# Altium footprint library разъёмы.PcbLib: 129 footprints (part 8 of 9)
Each footprint in its own frame and in the unit in brackets; x right, y up, seen from the top. Pads: shape width x height; smd on the part's side, far side on the other; paste and mask are expansions set on the pad; w line width, h text height; cw(c..) or ccw(c..) is an arc to the next point about the centre after c.
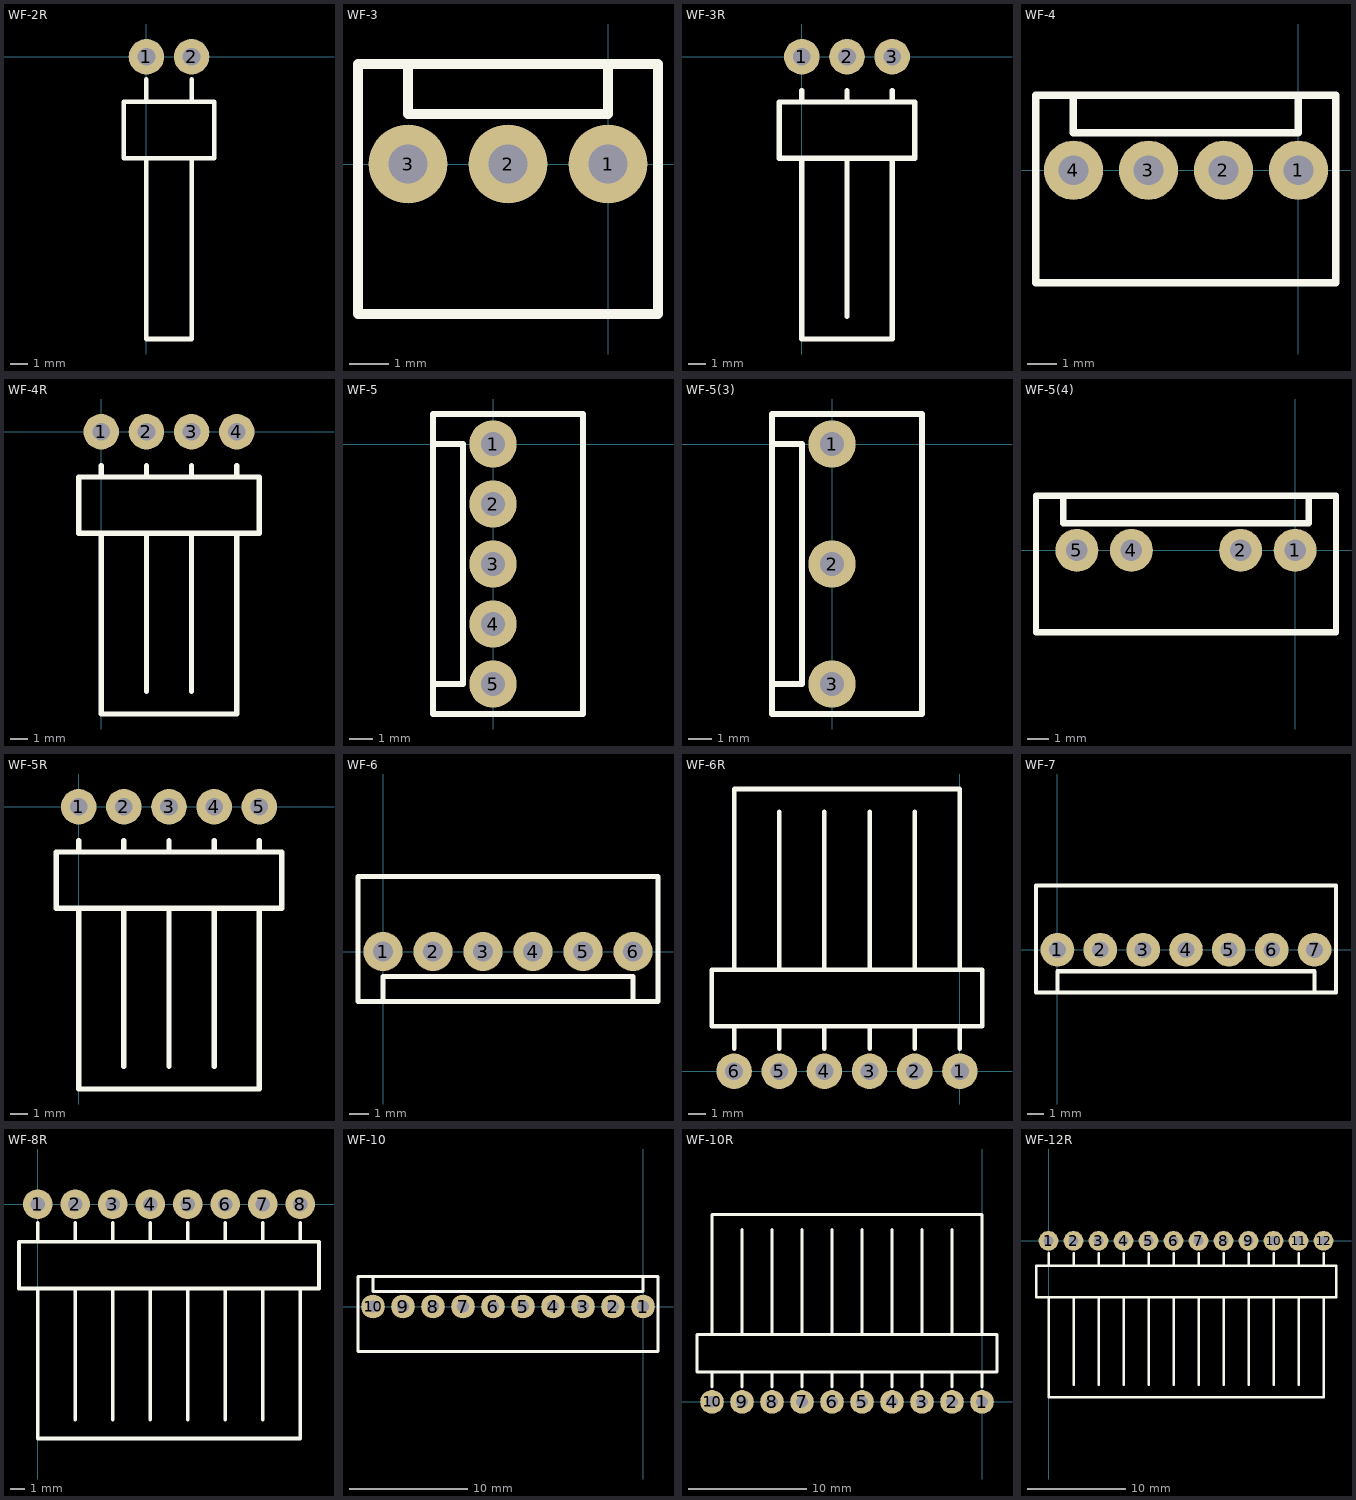
[diagram p7: the footprints below, top view; thin cyan lines are the x and y axes]

## WF-2R [mm]
pads (2):
  round 2 hole 1: 1(0,0) 2(2.54,0)
Top Overlay:
  lines w0.254: 0,-2.54 0,-1.27 ; 2.54,-5.715 2.54,-15.875 0,-15.875 0,-5.715 -1.27,-5.715 ; 2.54,-2.54 2.54,-1.27 ; -1.27,-5.715 3.81,-5.715 3.81,-2.54 -1.27,-2.54 -1.27,-5.715

## WF-3 [mm]
pads (3):
  round 2 hole 1: 1(0,0) 2(-2.54,0) 3(-5.08,0)
Top Overlay:
  lines w0.254: -5.08,2.54 -5.08,1.27 0,1.27 0,2.54 ; -6.35,-3.81 -6.35,2.54 1.27,2.54 1.27,-3.81 -6.35,-3.81

## WF-3R [mm]
pads (3):
  round 2 hole 1: 1(0,0) 2(2.54,0) 3(5.08,0)
Top Overlay:
  lines w0.3: 0,-2.54 0,-1.905 ; 2.54,-14.605 2.54,-5.715 ; 2.54,-2.54 2.54,-1.905 ; 5.08,-5.715 5.08,-15.875 0,-15.875 0,-5.715 -1.27,-5.715 ; 5.08,-2.54 5.08,-1.905 ; -1.27,-5.715 6.35,-5.715 6.35,-2.54 -1.27,-2.54 -1.27,-5.715

## WF-4 [mm]
pads (4):
  round 2 hole 1: 1(0,0) 2(-2.54,0) 3(-5.08,0) 4(-7.62,0)
Top Overlay:
  lines w0.254: -7.62,2.54 -7.62,1.27 0,1.27 0,2.54 ; -8.89,-3.81 -8.89,2.54 1.27,2.54 1.27,-3.81 -8.89,-3.81

## WF-4R [mm]
pads (4):
  round 2 hole 1: 1(0,0) 2(2.54,0) 3(5.08,0) 4(7.62,0)
Top Overlay:
  lines w0.3: 0,-2.54 0,-1.905 ; 2.54,-14.605 2.54,-5.715 ; 2.54,-2.54 2.54,-1.905 ; 5.08,-14.605 5.08,-5.715 ; 5.08,-2.54 5.08,-1.905 ; 7.62,-2.54 7.62,-1.905 ; -1.27,-5.715 0,-5.715 0,-15.875 7.62,-15.875 7.62,-5.715 8.89,-5.715 ; -1.27,-5.715 -1.27,-2.54 8.89,-2.54 8.89,-5.715 ; -1.27,-5.715 8.89,-5.715

## WF-5 [mm]
pads (5):
  round 2 hole 1: 1(0,0) 2(0,-2.54) 3(0,-5.08) 4(0,-7.62) 5(0,-10.16)
Top Overlay:
  lines w0.254: -2.54,-10.16 -1.27,-10.16 -1.27,0 -2.54,0 ; -2.54,-11.43 -2.54,1.27 3.81,1.27 3.81,-11.43 -2.54,-11.43

## WF-5(3) [mm]
pads (3):
  round 2 hole 1: 1(0,0) 2(0,-5.08) 3(0,-10.16)
Top Overlay:
  lines w0.254: -2.54,-10.16 -1.27,-10.16 -1.27,0 -2.54,0 ; -2.54,-11.43 -2.54,1.27 3.81,1.27 3.81,-11.43 -2.54,-11.43

## WF-5(4) [mm]
pads (4):
  round 2 hole 1: 1(0,0) 2(-2.54,0) 4(-7.62,0) 5(-10.16,0)
Top Overlay:
  lines w0.3: -10.795,2.54 -10.795,1.27 0.635,1.27 0.635,2.54 ; -12.065,-3.81 -12.065,2.54 1.905,2.54 1.905,-3.81 -12.065,-3.81

## WF-5R [mm]
pads (5):
  round 2 hole 1: 1(0,0) 2(2.54,0) 3(5.08,0) 4(7.62,0) 5(10.16,0)
Top Overlay:
  lines w0.3: 0,-2.54 0,-1.905 ; 2.54,-14.605 2.54,-5.715 ; 2.54,-2.54 2.54,-1.905 ; 5.08,-14.605 5.08,-5.715 ; 5.08,-2.54 5.08,-1.905 ; 7.62,-14.605 7.62,-5.715 ; 7.62,-2.54 7.62,-1.905 ; 10.16,-2.54 10.16,-1.905 ; -1.27,-5.715 0,-5.715 0,-15.875 10.16,-15.875 10.16,-5.715 ; -1.27,-5.715 -1.27,-2.54 11.43,-2.54 11.43,-5.715 10.16,-5.715 ; -1.27,-5.715 10.16,-5.715

## WF-6 [mm]
pads (6):
  round 2 hole 1: 1(0,0) 2(2.54,0) 3(5.08,0) 4(7.62,0) 5(10.16,0) 6(12.7,0)
Top Overlay:
  lines w0.254: 0,-2.54 0,-1.27 12.7,-1.27 12.7,-2.54 ; -1.27,-2.54 -1.27,3.81 13.97,3.81 13.97,-2.54 -1.27,-2.54

## WF-6R [mm]
pads (6):
  round 2 hole 1: 1(0,0) 2(-2.54,0) 3(-5.08,0) 4(-7.62,0) 5(-10.16,0) 6(-12.7,0)
Top Overlay:
  lines w0.254: -12.7,1.27 -12.7,2.54 ; -10.16,1.27 -10.16,2.54 ; -10.16,5.715 -10.16,14.605 ; -7.62,1.27 -7.62,2.54 ; -7.62,5.715 -7.62,14.605 ; -5.08,1.27 -5.08,2.54 ; -5.08,5.715 -5.08,14.605 ; -2.54,1.27 -2.54,2.54 ; -2.54,5.715 -2.54,14.605 ; 0,1.27 0,2.54 ; -13.97,5.715 -13.97,2.54 1.27,2.54 1.27,5.715 ; -13.97,5.715 -12.7,5.715 -12.7,15.875 0,15.875 0,5.715 1.27,5.715 ; -13.97,5.715 1.27,5.715

## WF-7 [mm]
pads (7):
  round 2 hole 1: 1(0,0) 2(2.54,0) 3(5.08,0) 4(7.62,0) 5(10.16,0) 6(12.7,0) 7(15.24,0)
Top Overlay:
  lines w0.254: 0,-2.54 0,-1.27 15.24,-1.27 15.24,-2.54 ; -1.27,-2.54 -1.27,3.81 16.51,3.81 16.51,-2.54 -1.27,-2.54

## WF-8R [mm]
pads (8):
  round 2 hole 1: 1(0,0) 2(2.54,0) 3(5.08,0) 4(7.62,0) 5(10.16,0) 6(12.7,0) 7(15.24,0) 8(17.78,0)
Top Overlay:
  lines w0.254: 0,-2.54 0,-1.27 ; 2.54,-14.605 2.54,-5.715 ; 2.54,-2.54 2.54,-1.27 ; 5.08,-14.605 5.08,-5.715 ; 5.08,-2.54 5.08,-1.27 ; 7.62,-14.605 7.62,-5.715 ; 7.62,-2.54 7.62,-1.27 ; 10.16,-14.605 10.16,-5.715 ; 10.16,-2.54 10.16,-1.27 ; 12.7,-14.605 12.7,-5.715 ; 12.7,-2.54 12.7,-1.27 ; 15.24,-14.605 15.24,-5.715 ; 15.24,-2.54 15.24,-1.27 ; 17.78,-5.715 17.78,-15.875 0,-15.875 0,-5.715 -1.27,-5.715 ; 17.78,-2.54 17.78,-1.27 ; -1.27,-5.715 -1.27,-2.54 19.05,-2.54 19.05,-5.715 -1.27,-5.715

## WF-10 [mm]
pads (10):
  round 2 hole 1: 1(0,0) 2(-2.54,0) 3(-5.08,0) 4(-7.62,0) 5(-10.16,0) 6(-12.7,0) 7(-15.24,0) 8(-17.78,0) 9(-20.32,0) 10(-22.86,0)
Top Overlay:
  lines w0.254: -22.86,2.54 -22.86,1.27 0,1.27 0,2.54 ; -24.13,-3.81 -24.13,2.54 1.27,2.54 1.27,-3.81 -24.13,-3.81

## WF-10R [mm]
pads (10):
  round 2 hole 1: 1(0,0) 2(-2.54,0) 3(-5.08,0) 4(-7.62,0) 5(-10.16,0) 6(-12.7,0) 7(-15.24,0) 8(-17.78,0) 9(-20.32,0) 10(-22.86,0)
Top Overlay:
  lines w0.254: -22.86,1.27 -22.86,2.54 ; -22.86,5.715 -22.86,15.875 0,15.875 0,5.715 1.27,5.715 ; -20.32,1.27 -20.32,2.54 ; -20.32,5.715 -20.32,14.605 ; -17.78,1.27 -17.78,2.54 ; -17.78,5.715 -17.78,14.605 ; -15.24,1.27 -15.24,2.54 ; -15.24,5.715 -15.24,14.605 ; -12.7,1.27 -12.7,2.54 ; -12.7,5.715 -12.7,14.605 ; -10.16,1.27 -10.16,2.54 ; -10.16,5.715 -10.16,14.605 ; -7.62,1.27 -7.62,2.54 ; -7.62,5.715 -7.62,14.605 ; -5.08,1.27 -5.08,2.54 ; -5.08,5.715 -5.08,14.605 ; -2.54,1.27 -2.54,2.54 ; -2.54,5.715 -2.54,14.605 ; 0,1.27 0,2.54 ; 1.27,5.715 1.27,2.54 -24.13,2.54 -24.13,5.715 1.27,5.715

## WF-12R [mm]
pads (12):
  round 2 hole 1: 1(0,0) 2(2.54,0) 3(5.08,0) 4(7.62,0) 5(10.16,0) 6(12.7,0) 7(15.24,0) 8(17.78,0) 9(20.32,0) 10(22.86,0) 11(25.4,0) 12(27.94,0)
Top Overlay:
  lines w0.254: 0,-2.54 0,-1.27 ; 2.54,-14.605 2.54,-5.715 ; 2.54,-2.54 2.54,-1.27 ; 5.08,-14.605 5.08,-5.715 ; 5.08,-2.54 5.08,-1.27 ; 7.62,-14.605 7.62,-5.715 ; 7.62,-2.54 7.62,-1.27 ; 10.16,-14.605 10.16,-5.715 ; 10.16,-2.54 10.16,-1.27 ; 12.7,-14.605 12.7,-5.715 ; 12.7,-2.54 12.7,-1.27 ; 15.24,-14.605 15.24,-5.715 ; 15.24,-2.54 15.24,-1.27 ; 17.78,-14.605 17.78,-5.715 ; 17.78,-2.54 17.78,-1.27 ; 20.32,-14.605 20.32,-5.715 ; 20.32,-2.54 20.32,-1.27 ; 22.86,-14.605 22.86,-5.715 ; 22.86,-2.54 22.86,-1.27 ; 25.4,-14.605 25.4,-5.715 ; 25.4,-2.54 25.4,-1.27 ; 27.94,-5.715 27.94,-15.875 0,-15.875 0,-5.715 -1.27,-5.715 ; 27.94,-2.54 27.94,-1.27 ; -1.27,-5.715 29.21,-5.715 29.21,-2.54 -1.27,-2.54 -1.27,-5.715